# Altium integrated library TI Power Management Battery Management.IntLib: 950 symbols (part 46 of 48)
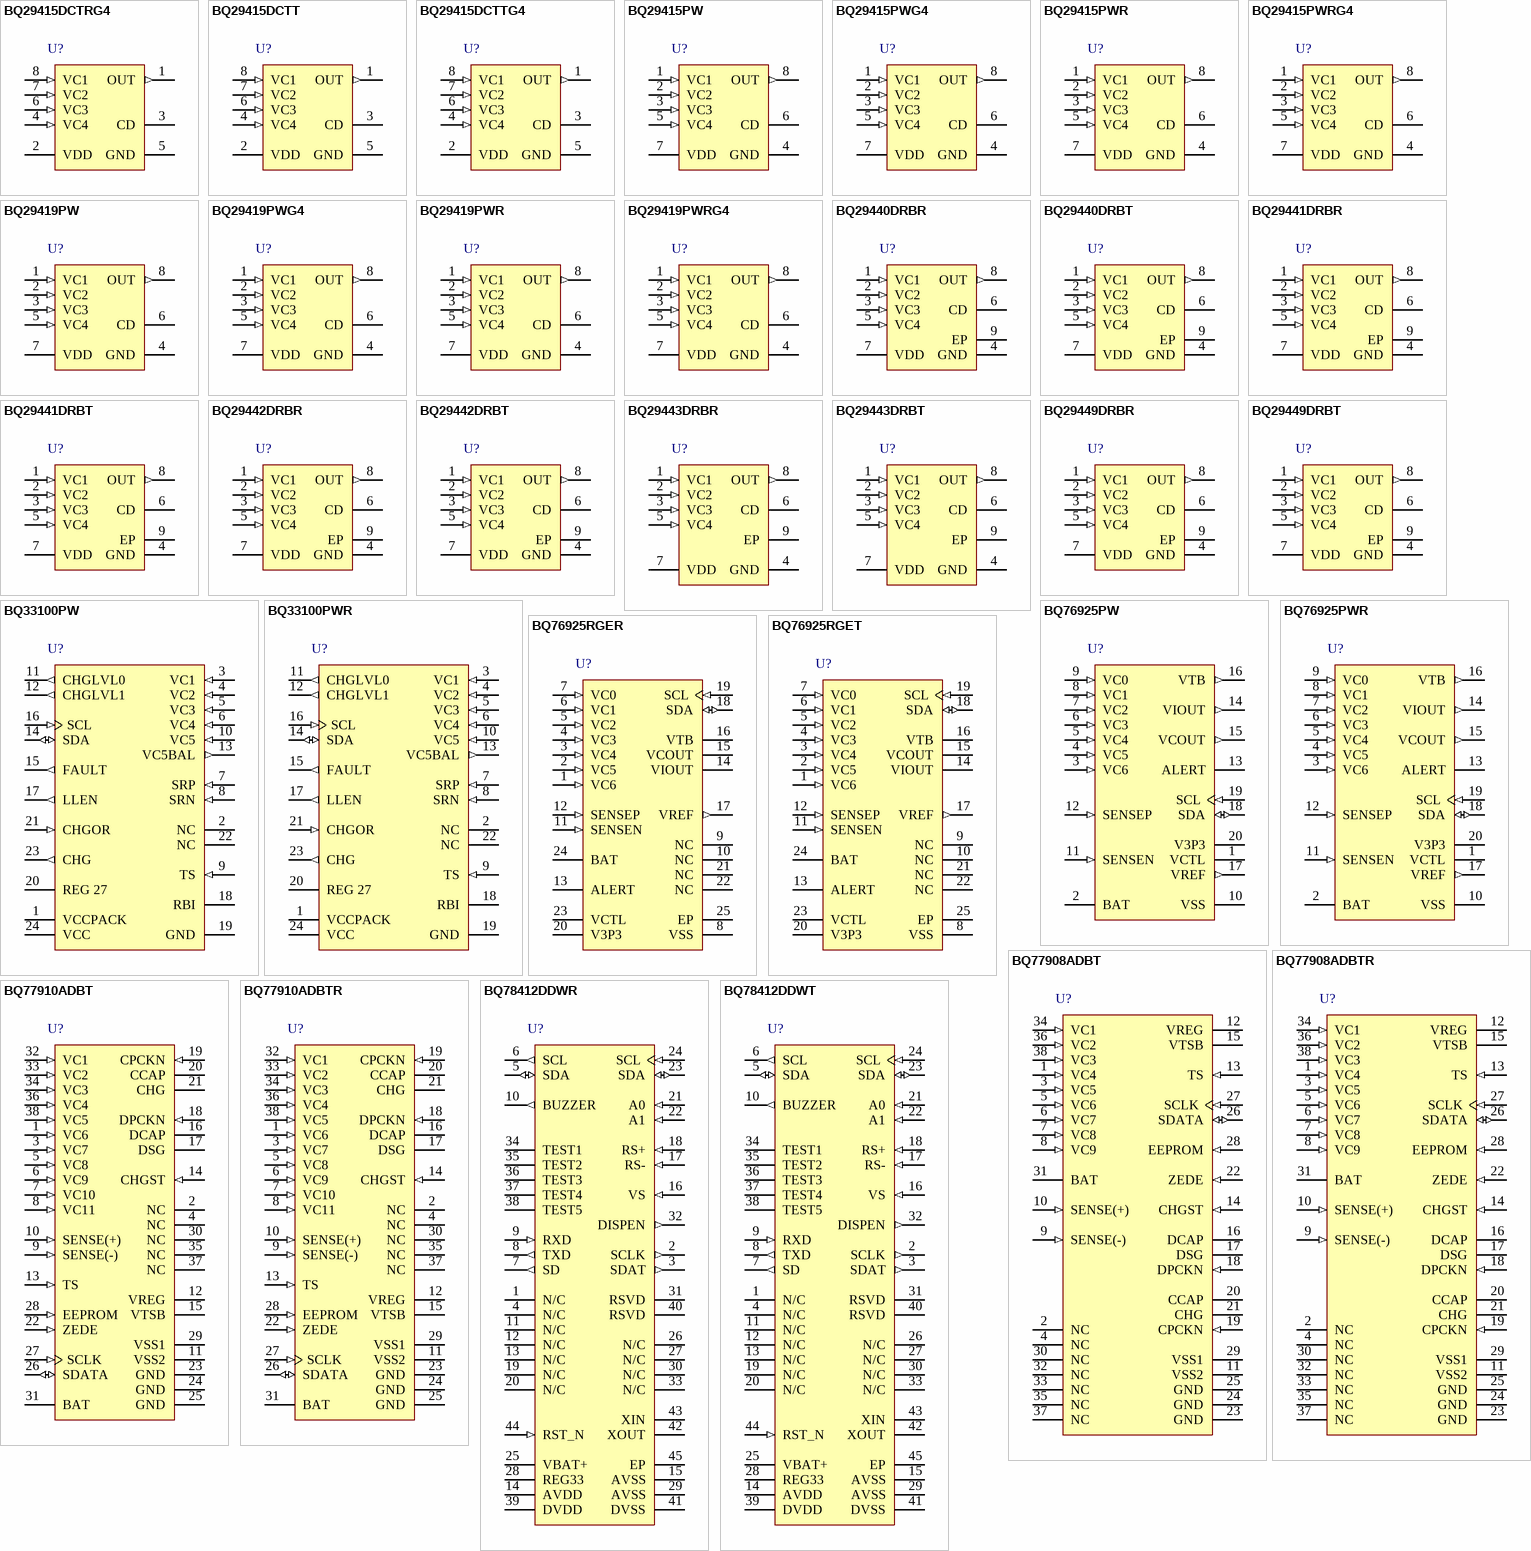
[diagram p79: symbols BQ29415DCTRG4 to BQ78412DDWT]

## BQ76925RGET
designator U?
Analog Front End for 3 to 6 Series Lithium-Ion Cells, -25 to 85 degC, 24-pin VQFN (RGE), Green (RoHS & no Sb/Br); PartNumber: BQ76925RGET; Manufacturer: Texas Instruments; Lead Acid: N; Li-Ion: Y; SubFamily: Lithium Ion Protection; DatasheetVersion: SLUSAM9B; PackageVersion: revG, Jul-2011; PackageReference: RGE24-2450X2450TP; PackageDescription: 24-Pin Plastic Quad Flatpack No-Lead, 4 x 4 mm Body, 0.5 mm Pitch; Supplier 1: Digi-Key; Supplier Part Number 1: 296-30167-2-ND; Supplier Part Number 3: 296-30167-6-ND; Eco-Plan: Green (RoHS & no Sb/Br); Li-Polymer: Y; NiCd: N; NiMH: N; Over Voltage Protection: N; Mounting Technology: Surface Mount; Code_JEDEC: MO-220; ComponentLink1Description: Datasheet; ComponentLink1URL: http://www.ti.com/general/docs/lit/getliterature.tsp?genericPartNumber=BQ76925&fileType=pdf
footprint RGE24-2450X2450TP (QFN, 24-Leads, Body 4x4mm, Pitch 0.5mm, Thermal Pad 2.45x2.45mm, TI Recommended)
pins: 1 VC6 (in) "Sense voltage for most positive cell.", 2 VC5 (in) "Sense voltage for second most positive cell.", 3 VC4 (in) "Sense voltage for third most positive cell.", 4 VC3 (in) "Sense voltage for fourth most positive cell.", 5 VC2 (in) "Sense voltage for fifth most positive cell.", 6 VC1 (in) "Sense voltage for least positive cell.", 7 VC0 (in) "Sense voltage for negative end of cell stack.", 8 VSS (power) "Ground.", 9 NC "No Connection (leave open).", 10 NC "No Connection (leave open).", 11 SENSEN (in) "Negative current sense.", 12 SENSEP (in) "Positive current sense.", 13 ALERT (oc) "Overcurrent alert (open drain).", 14 VIOUT (power) "Current measurement voltage.", 15 VCOUT (power) "Cell measurement voltage.", 16 VTB (power) "Bias voltage for thermistor network.", 17 VREF (out) "Reference voltage for ADC.", 18 SDA (io) "I2C Data (open drain).", 19 SCL (in) "I2C Clock (open drain).", 20 V3P3 (power) "3.3-V Regulator.", 21 NC "No Connection (leave open).", 22 NC "No Connection (leave open).", 23 VCTL (power) "3.3-V Regulator control voltage.", 24 BAT (power) "Supply voltage, tied to most positive cell.", 25 EP "The thermal pad must be soldered directly to the printed circuit board (PCB)."

## BQ77908ADBT
designator U?
Stand-Alone Multi-Cell Li-Ion / Li-Polymer Precision Protector, -40 to 85 degC, 38-pin TSSOP (DBT), Green (RoHS & no Sb/Br); PartNumber: BQ77908ADBT; Manufacturer: Texas Instruments; Lead Acid: N; Li-Ion: Y; SubFamily: Lithium Ion Protection; DatasheetVersion: SLUSAV5; PackageVersion: revI, Mar-2011; PackageReference: DBT38; PackageDescription: 38-Pin Plastic Small Outline 0.5 mm Pitch; Supplier 1: Digi-Key; Supplier Part Number 1: 296-31359-ND; Supplier Part Number 3: 595-BQ77908ADBT; Eco-Plan: Green (RoHS & no Sb/Br); Li-Polymer: Y; NiCd: N; NiMH: N; Over Voltage Protection: Y; Mounting Technology: Surface Mount; Code_JEDEC: MO-153; ComponentLink1Description: Datasheet; ComponentLink1URL: http://www.ti.com/general/docs/lit/getliterature.tsp?genericPartNumber=BQ77908A&fileType=pdf
footprint DBT38_N (TSSOP, 38-Leads, Body 9.7x4.4mm, Pitch 0.5mm, IPC Medium Density)
footprint DBT38_L (TSSOP, 38-Leads, Body 9.7x4.4mm, Pitch 0.5mm, IPC High Density)
footprint DBT38_M (TSSOP, 38-Leads, Body 9.7x4.4mm, Pitch 0.5mm, IPC Low Density)
pins: 1 VC4 (in) "Sense-voltage input terminal for fourth-most-positive cell", 2 NC "No connect (DO NOT CONNECT) externally. Failure to leave NC pins open can cause faulty operation.", 3 VC5 (in) "Sense-voltage input terminal for fifth-most-positive cell", 4 NC "No connect (DO NOT CONNECT) externally. Failure to leave NC pins open can cause faulty operation.", 5 VC6 (in) "Sense-voltage input terminal for sixth-most-positive cell", 6 VC7 (in) "Sense-voltage input terminal for seventh-most-positive cell", 7 VC8 (in) "Sense-voltage input terminal for eighthmost-positive (most-negative) cell", 8 VC9 (in) "Most-negative cell(-) terminal (BAT-)", 9 SENSE(-) (in) "Current-sense input", 10 SENSE(+) (in) "Current-sense input", 11 VSS2 (power) "Analog ground (substrate reference)", 12 VREG (power) "Integrated 3.3-V regulator output", 13 TS (in) "Temperature sensing input", 14 CHGST (in) "Charger-status input, used to detect charger connection/wakeup", 15 VTSB (power) "Thermistor bias supply (sourced from VREG)", 16 DCAP "Energy storage capacitor for discharge FET drive", 17 DSG "Discharge FET (n-channel) gate drive", 18 DPCKN (in) "Pack - discharge negative terminal (load return)", 19 CPCKN (in) "Pack - charger negative terminal (charger return)", 20 CCAP "Energy storage capacitor for charge FET drive", 21 CHG "Charge FET (n-channel) gate drive", 22 ZEDE (in) "Zero Delay test mode pin. Enables serial communications interface and minimizes protection delay times when connected to logic high.Connect to VSS for normal operation.A strong connection is recommended.", 23 GND (power) "Logic ground (not for power return or analog reference). Tie to VSS.", 24 GND (power) "Logic ground (not for power return or analog reference). Tie to VSS.", 25 GND (power) "Logic ground (not for power return or analog reference). Tie to VSS.", 26 SDATA (io) "Serial-communication data input/output used for EEPROM programming (open-drain)", 27 SCLK (in) "Serial-communication clock input used for EEPROM programming", 28 EEPROM (in) "EEPROM programming voltage input. Connect to VSS for normal operation.", 29 VSS1 (power) "Analog ground (substrate reference)", 30 NC "No connect (DO NOT CONNECT) externally. Failure to leave NC pins open can cause faulty operation.", 31 BAT (power) "Power supply voltage, tied to highest cell(+)", 32 NC "No connect (DO NOT CONNECT) externally. Failure to leave NC pins open can cause faulty operation.", 33 NC "No connect (DO NOT CONNECT) externally. Failure to leave NC pins open can cause faulty operation.", 34 VC1 (in) "Sense-voltage input terminal for most-positive cell", 35 NC "No connect (DO NOT CONNECT) externally. Failure to leave NC pins open can cause faulty operation.", 36 VC2 (in) "Sense-voltage input terminal for second-most-positive cell", 37 NC "No connect (DO NOT CONNECT) externally. Failure to leave NC pins open can cause faulty operation.", 38 VC3 (in) "Sense-voltage input terminal for third-most-positive cell"

## BQ77908ADBTR
designator U?
Stand-Alone Multi-Cell Li-Ion / Li-Polymer Precision Protector, -40 to 85 degC, 38-pin TSSOP (DBT), Green (RoHS & no Sb/Br); PartNumber: BQ77908ADBTR; Manufacturer: Texas Instruments; Lead Acid: N; Li-Ion: Y; SubFamily: Lithium Ion Protection; DatasheetVersion: SLUSAV5; PackageVersion: revI, Mar-2011; PackageReference: DBT38; PackageDescription: 38-Pin Plastic Small Outline 0.5 mm Pitch; Supplier 1: Digi-Key; Supplier Part Number 1: BQ77908ADBTR-ND; Supplier Part Number 3: 595-BQ77908ADBTR; Eco-Plan: Green (RoHS & no Sb/Br); Li-Polymer: Y; NiCd: N; NiMH: N; Over Voltage Protection: Y; Mounting Technology: Surface Mount; Code_JEDEC: MO-153; ComponentLink1Description: Datasheet; ComponentLink1URL: http://www.ti.com/general/docs/lit/getliterature.tsp?genericPartNumber=BQ77908A&fileType=pdf
footprint DBT38_N (TSSOP, 38-Leads, Body 9.7x4.4mm, Pitch 0.5mm, IPC Medium Density)
footprint DBT38_L (TSSOP, 38-Leads, Body 9.7x4.4mm, Pitch 0.5mm, IPC High Density)
footprint DBT38_M (TSSOP, 38-Leads, Body 9.7x4.4mm, Pitch 0.5mm, IPC Low Density)
pins: 1 VC4 (in) "Sense-voltage input terminal for fourth-most-positive cell", 2 NC "No connect (DO NOT CONNECT) externally. Failure to leave NC pins open can cause faulty operation.", 3 VC5 (in) "Sense-voltage input terminal for fifth-most-positive cell", 4 NC "No connect (DO NOT CONNECT) externally. Failure to leave NC pins open can cause faulty operation.", 5 VC6 (in) "Sense-voltage input terminal for sixth-most-positive cell", 6 VC7 (in) "Sense-voltage input terminal for seventh-most-positive cell", 7 VC8 (in) "Sense-voltage input terminal for eighthmost-positive (most-negative) cell", 8 VC9 (in) "Most-negative cell(-) terminal (BAT-)", 9 SENSE(-) (in) "Current-sense input", 10 SENSE(+) (in) "Current-sense input", 11 VSS2 (power) "Analog ground (substrate reference)", 12 VREG (power) "Integrated 3.3-V regulator output", 13 TS (in) "Temperature sensing input", 14 CHGST (in) "Charger-status input, used to detect charger connection/wakeup", 15 VTSB (power) "Thermistor bias supply (sourced from VREG)", 16 DCAP "Energy storage capacitor for discharge FET drive", 17 DSG "Discharge FET (n-channel) gate drive", 18 DPCKN (in) "Pack - discharge negative terminal (load return)", 19 CPCKN (in) "Pack - charger negative terminal (charger return)", 20 CCAP "Energy storage capacitor for charge FET drive", 21 CHG "Charge FET (n-channel) gate drive", 22 ZEDE (in) "Zero Delay test mode pin. Enables serial communications interface and minimizes protection delay times when connected to logic high.Connect to VSS for normal operation.A strong connection is recommended.", 23 GND (power) "Logic ground (not for power return or analog reference). Tie to VSS.", 24 GND (power) "Logic ground (not for power return or analog reference). Tie to VSS.", 25 GND (power) "Logic ground (not for power return or analog reference). Tie to VSS.", 26 SDATA (io) "Serial-communication data input/output used for EEPROM programming (open-drain)", 27 SCLK (in) "Serial-communication clock input used for EEPROM programming", 28 EEPROM (in) "EEPROM programming voltage input. Connect to VSS for normal operation.", 29 VSS1 (power) "Analog ground (substrate reference)", 30 NC "No connect (DO NOT CONNECT) externally. Failure to leave NC pins open can cause faulty operation.", 31 BAT (power) "Power supply voltage, tied to highest cell(+)", 32 NC "No connect (DO NOT CONNECT) externally. Failure to leave NC pins open can cause faulty operation.", 33 NC "No connect (DO NOT CONNECT) externally. Failure to leave NC pins open can cause faulty operation.", 34 VC1 (in) "Sense-voltage input terminal for most-positive cell", 35 NC "No connect (DO NOT CONNECT) externally. Failure to leave NC pins open can cause faulty operation.", 36 VC2 (in) "Sense-voltage input terminal for second-most-positive cell", 37 NC "No connect (DO NOT CONNECT) externally. Failure to leave NC pins open can cause faulty operation.", 38 VC3 (in) "Sense-voltage input terminal for third-most-positive cell"

## BQ77910ADBT
designator U?
Standalone 4-10 Cell Precision Protector for Li-Ion Chemistries, -40 to 85 degC, 38-pin TSSOP (DBT), Green (RoHS & no Sb/Br); PartNumber: BQ77910ADBT; Manufacturer: Texas Instruments; Lead Acid: N; Li-Ion: Y; SubFamily: Lithium Ion Protection; DatasheetVersion: SLUSAV6; PackageVersion: revI, Mar-2011; PackageReference: DBT38; PackageDescription: 38-Pin Plastic Small Outline 0.5 mm Pitch; Supplier 1: Digi-Key; Supplier Part Number 1: 296-31360-ND; Supplier Part Number 3: 595-BQ77910ADBT; Eco-Plan: Green (RoHS & no Sb/Br); Li-Polymer: Y; NiCd: N; NiMH: N; Over Voltage Protection: Y; Mounting Technology: Surface Mount; Code_JEDEC: MO-153; ComponentLink1Description: Datasheet; ComponentLink1URL: http://www.ti.com/general/docs/lit/getliterature.tsp?genericPartNumber=BQ77910A&fileType=pdf
footprint DBT38_N (TSSOP, 38-Leads, Body 9.7x4.4mm, Pitch 0.5mm, IPC Medium Density)
footprint DBT38_L (TSSOP, 38-Leads, Body 9.7x4.4mm, Pitch 0.5mm, IPC High Density)
footprint DBT38_M (TSSOP, 38-Leads, Body 9.7x4.4mm, Pitch 0.5mm, IPC Low Density)
pins: 1 VC6 (in) "Sense-voltage input terminal for sixth-most-positive cell.", 2 NC "No connect (DO NOT CONNECT) externally. Failure to leave NC pins open can cause faulty operation.", 3 VC7 (in) "Sense-voltage input terminal for seventh-most-positive cell.", 4 NC "No connect (DO NOT CONNECT) externally. Failure to leave NC pins open can cause faulty operation.", 5 VC8 (in) "Sense-voltage input terminal for eighth-most-positive cell.", 6 VC9 (in) "Sense-voltage input terminal for ninth-most-positive cell.", 7 VC10 (in) "Sense-voltage input terminal for tenthmost-positive (most-negative) cell.", 8 VC11 (in) "Most-negative cell(-) terminal (BAT-).", 9 SENSE(-) (in) "Current-sense input.", 10 SENSE(+) (in) "Current-sense input.", 11 VSS2 (power) "Analog ground (substrate reference).", 12 VREG (power) "Integrated 3.3-V regulator output.", 13 TS (in) "Temperature sensing input.", 14 CHGST (in) "Charger-status input, used to detect charger connection/wakeup.", 15 VTSB "Thermistor bias supply (sourced from VREG).", 16 DCAP "Energy storage capacitor for discharge FET drive.", 17 DSG "Discharge FET (n-channel) gate drive.", 18 DPCKN (in) "Pack - discharge negative terminal (load return).", 19 CPCKN (in) "Pack - charger negative terminal (charger return).", 20 CCAP "Energy storage capacitor for charge FET drive.", 21 CHG "Charge FET (n-channel) gate drive.", 22 ZEDE (in) "Zero Delay test mode pin. Enables serial communications interface and minimizes protection delay times when connected to logic high. Connect to VSS for normal operation. A strong connection is recommended.", 23 GND (power) "Logic ground (not for power return or analog reference). Tie to VSS.", 24 GND (power) "Logic ground (not for power return or analog reference). Tie to VSS.", 25 GND (power) "Logic ground (not for power return or analog reference). Tie to VSS.", 26 SDATA (io) "Serial-communication data input/output used for EEPROM programming (open-drain).", 27 SCLK (in) "Serial-communication clock input used for EEPROM programming.", 28 EEPROM (in) "EEPROM programming voltage input. Connect to VSS for normal operation.", 29 VSS1 (power) "Analog ground (substrate reference).", 30 NC "No connect (DO NOT CONNECT) externally. Failure to leave NC pins open can cause faulty operation.", 31 BAT (power) "Power supply voltage, tied to highest cell(+).", 32 VC1 (in) "Sense-voltage input terminal for most-positive cell.", 33 VC2 (in) "Sense-voltage input terminal for second-most-positive cell.", 34 VC3 (in) "Sense-voltage input terminal for third-most-positive cell.", 35 NC "No connect (DO NOT CONNECT) externally. Failure to leave NC pins open can cause faulty operation.", 36 VC4 (in) "Sense-voltage input terminal for fourth-most-positive cell.", 37 NC "No connect (DO NOT CONNECT) externally. Failure to leave NC pins open can cause faulty operation.", 38 VC5 (in) "Sense-voltage input terminal for fifth-most-positive cell."

## BQ77910ADBTR
designator U?
Standalone 4-10 Cell Precision Protector for Li-Ion Chemistries, -40 to 85 degC, 38-pin TSSOP (DBT), Green (RoHS & no Sb/Br); PartNumber: BQ77910ADBTR; Manufacturer: Texas Instruments; Lead Acid: N; Li-Ion: Y; SubFamily: Battery Charge Management; DatasheetVersion: SLUSAV6; PackageVersion: revI, Mar-2011; PackageReference: DBT38; PackageDescription: 38-Pin Plastic Small Outline 0.5 mm Pitch; Supplier 1: Digi-Key; Supplier Part Number 1: 296-30251-2-ND; Supplier Part Number 3: 296-30251-6-ND; Eco-Plan: Green (RoHS & no Sb/Br); Li-Polymer: Y; NiCd: N; NiMH: N; Over Voltage Protection: Y; Mounting Technology: Surface Mount; Code_JEDEC: MO-153; ComponentLink1Description: Datasheet; ComponentLink1URL: http://www.ti.com/general/docs/lit/getliterature.tsp?genericPartNumber=BQ77910A&fileType=pdf
footprint DBT38_N (TSSOP, 38-Leads, Body 9.7x4.4mm, Pitch 0.5mm, IPC Medium Density)
footprint DBT38_L (TSSOP, 38-Leads, Body 9.7x4.4mm, Pitch 0.5mm, IPC High Density)
footprint DBT38_M (TSSOP, 38-Leads, Body 9.7x4.4mm, Pitch 0.5mm, IPC Low Density)
pins: 1 VC6 (in) "Sense-voltage input terminal for sixth-most-positive cell.", 2 NC "No connect (DO NOT CONNECT) externally. Failure to leave NC pins open can cause faulty operation.", 3 VC7 (in) "Sense-voltage input terminal for seventh-most-positive cell.", 4 NC "No connect (DO NOT CONNECT) externally. Failure to leave NC pins open can cause faulty operation.", 5 VC8 (in) "Sense-voltage input terminal for eighth-most-positive cell.", 6 VC9 (in) "Sense-voltage input terminal for ninth-most-positive cell.", 7 VC10 (in) "Sense-voltage input terminal for tenthmost-positive (most-negative) cell.", 8 VC11 (in) "Most-negative cell(-) terminal (BAT-).", 9 SENSE(-) (in) "Current-sense input.", 10 SENSE(+) (in) "Current-sense input.", 11 VSS2 (power) "Analog ground (substrate reference).", 12 VREG (power) "Integrated 3.3-V regulator output.", 13 TS (in) "Temperature sensing input.", 14 CHGST (in) "Charger-status input, used to detect charger connection/wakeup.", 15 VTSB "Thermistor bias supply (sourced from VREG).", 16 DCAP "Energy storage capacitor for discharge FET drive.", 17 DSG "Discharge FET (n-channel) gate drive.", 18 DPCKN (in) "Pack - discharge negative terminal (load return).", 19 CPCKN (in) "Pack - charger negative terminal (charger return).", 20 CCAP "Energy storage capacitor for charge FET drive.", 21 CHG "Charge FET (n-channel) gate drive.", 22 ZEDE (in) "Zero Delay test mode pin. Enables serial communications interface and minimizes protection delay times when connected to logic high. Connect to VSS for normal operation. A strong connection is recommended.", 23 GND (power) "Logic ground (not for power return or analog reference). Tie to VSS.", 24 GND (power) "Logic ground (not for power return or analog reference). Tie to VSS.", 25 GND (power) "Logic ground (not for power return or analog reference). Tie to VSS.", 26 SDATA (io) "Serial-communication data input/output used for EEPROM programming (open-drain).", 27 SCLK (in) "Serial-communication clock input used for EEPROM programming.", 28 EEPROM (in) "EEPROM programming voltage input. Connect to VSS for normal operation.", 29 VSS1 (power) "Analog ground (substrate reference).", 30 NC "No connect (DO NOT CONNECT) externally. Failure to leave NC pins open can cause faulty operation.", 31 BAT (power) "Power supply voltage, tied to highest cell(+).", 32 VC1 (in) "Sense-voltage input terminal for most-positive cell.", 33 VC2 (in) "Sense-voltage input terminal for second-most-positive cell.", 34 VC3 (in) "Sense-voltage input terminal for third-most-positive cell.", 35 NC "No connect (DO NOT CONNECT) externally. Failure to leave NC pins open can cause faulty operation.", 36 VC4 (in) "Sense-voltage input terminal for fourth-most-positive cell.", 37 NC "No connect (DO NOT CONNECT) externally. Failure to leave NC pins open can cause faulty operation.", 38 VC5 (in) "Sense-voltage input terminal for fifth-most-positive cell."

## BQ78412DDWR
designator U?
Pb-Acid Battery State-of-Charge Indicator with Run-Time Display, -40 to 85 degC, 44-pin HTSSOP (DDW), Green (RoHS & no Sb/Br); PartNumber: BQ78412DDWR; Manufacturer: Texas Instruments; Lead Acid: N; SubFamily: Battery Fuel Gauge; DatasheetVersion: SLUSAA0; PackageVersion: revB, Oct-2006; PackageReference: DDW44-7600X3850TP; PackageDescription: 44-Pin PowerPAD Small Outline Package (Pad Down) 0.635 mm Pitch; Supplier 1: Digi-Key; Supplier Part Number 1: BQ78412DDWR-ND; Supplier Part Number 3: 595-BQ78412DDWR; Eco-Plan: Green (RoHS & no Sb/Br); Li-Ion: N; Li-Polymer: N; NiCd: N; NiMH: N; Over Voltage Protection: N; Mounting Technology: Surface Mount; ComponentLink1Description: Datasheet; ComponentLink1URL: http://www.ti.com/general/docs/lit/getliterature.tsp?genericPartNumber=BQ78412&fileType=pdf
footprint DDW44-7600X3850TP_N (TSOP, 44-Leads, Body 14x6.1mm, Pitch 0.635mm, Thermal Pad 8.3x4.2mm, IPC Medium Density)
footprint DDW44-7600X3850TP_L (TSOP, 44-Leads, Body 14x6.1mm, Pitch 0.635mm, Thermal Pad 8.3x4.2mm, IPC High Density)
footprint DDW44-7600X3850TP_M (TSOP, 44-Leads, Body 14x6.1mm, Pitch 0.635mm, Thermal Pad 8.3x4.2mm, IPC Low Density)
pins: 1 N/C "No connection", 2 SCLK (out) "Low-to-high transition clocks data into external serial in, parallel out shift register.", 3 SDAT (out) "Serial display data to serial in, parallel out shift register. A low bit turns on an LED.", 4 N/C "No connection", 5 SDA (io) "I2C data", 6 SCL (out) "I2C clock output", 7 SD (out) "IR XCVR Shutdown; HIGH=XCVR in shutdown, LOW=XCVR Active", 8 TXD (out) "UART TX data", 9 RXD (in) "UART RX data", 10 BUZZER (out) "Buzzer output. Active high when alarm condition is detected.", 11 N/C "No connection", 12 N/C "No connection", 13 N/C "No connection", 14 AVDD (power) "3.3-V power to the analog logic. Typically connected to REG33.", 15 AVSS (power) "Connect to ground.", 16 VS (in) "Sense voltage. Connect to battery positive.", 17 RS- (in) "Current sense negative", 18 RS+ (in) "Current sense positive", 19 N/C "No connection", 20 N/C "No connection", 21 A0 (in) "Configuration input. Connect to ground.", 22 A1 (in) "Configuration input. Connect to ground.", 23 SDA (io) "I2C data for internal use. Connect to SDA pin 5.", 24 SCL (in) "I2C clock for internal use. Connect to SCL pin 6.", 25 VBAT+ (power) "Input to internal regulator.", 26 N/C "No connection", 27 N/C "No connection", 28 REG33 (power) "Regulated 3.3-V power output.", 29 AVSS (power) "Connect to ground.", 30 N/C "No connection", 31 RSVD "Reserved, no connection required.", 32 DISPEN (out) "Active high output, turns on display enable transistor. Not required in all applications. Blanks display during updates.", 33 N/C "No connection", 34 TEST1 "Test pin, no connection", 35 TEST2 "Test pin, no connection", 36 TEST3 "Test pin, no connection", 37 TEST4 "Test pin, no connection", 38 TEST5 "Test pin, no connection", 39 DVDD (power) "3.3-V supply to the digital logic. Connect a 2.2- uF capacitor to VSS. Typically connected to REG33.", 40 RSVD "Reserved, no connection required.", 41 DVSS (power) "Connect to ground", 42 XOUT "Output terminal of 8-MHz crystal oscillator or crystal pin. (Optional: Can be left unconnected to use internal oscillator)", 43 XIN "Input terminal of 8-MHz crystal oscillator or crystal pin. (Optional: Can be left unconnected to use internal oscillator)", 44 RST_N (in) "Connect to external RC network for power-up reset.", 45 EP (power) "Thermal pad"

## BQ78412DDWT
designator U?
Pb-Acid Battery State-of-Charge Indicator with Run-Time Display, -40 to 85 degC, 44-pin HTSSOP (DDW), Green (RoHS & no Sb/Br); PartNumber: BQ78412DDWT; Manufacturer: Texas Instruments; Lead Acid: N; SubFamily: Battery Fuel Gauge; DatasheetVersion: SLUSAA0; PackageVersion: revB, Oct-2006; PackageReference: DDW44-7600X3850TP; PackageDescription: 44-Pin PowerPAD Small Outline Package (Pad Down) 0.635 mm Pitch; Supplier 1: Digi-Key; Supplier Part Number 1: 296-27954-2-ND; Supplier Part Number 3: 296-27954-6-ND; Eco-Plan: Green (RoHS & no Sb/Br); Li-Ion: N; Li-Polymer: N; NiCd: N; NiMH: N; Over Voltage Protection: N; Mounting Technology: Surface Mount; ComponentLink1Description: Datasheet; ComponentLink1URL: http://www.ti.com/general/docs/lit/getliterature.tsp?genericPartNumber=BQ78412&fileType=pdf
footprint DDW44-7600X3850TP_N (TSOP, 44-Leads, Body 14x6.1mm, Pitch 0.635mm, Thermal Pad 8.3x4.2mm, IPC Medium Density)
footprint DDW44-7600X3850TP_L (TSOP, 44-Leads, Body 14x6.1mm, Pitch 0.635mm, Thermal Pad 8.3x4.2mm, IPC High Density)
footprint DDW44-7600X3850TP_M (TSOP, 44-Leads, Body 14x6.1mm, Pitch 0.635mm, Thermal Pad 8.3x4.2mm, IPC Low Density)
pins: 1 N/C "No connection", 2 SCLK (out) "Low-to-high transition clocks data into external serial in, parallel out shift register.", 3 SDAT (out) "Serial display data to serial in, parallel out shift register. A low bit turns on an LED.", 4 N/C "No connection", 5 SDA (io) "I2C data", 6 SCL (out) "I2C clock output", 7 SD (out) "IR XCVR Shutdown; HIGH=XCVR in shutdown, LOW=XCVR Active", 8 TXD (out) "UART TX data", 9 RXD (in) "UART RX data", 10 BUZZER (out) "Buzzer output. Active high when alarm condition is detected.", 11 N/C "No connection", 12 N/C "No connection", 13 N/C "No connection", 14 AVDD (power) "3.3-V power to the analog logic. Typically connected to REG33.", 15 AVSS (power) "Connect to ground.", 16 VS (in) "Sense voltage. Connect to battery positive.", 17 RS- (in) "Current sense negative", 18 RS+ (in) "Current sense positive", 19 N/C "No connection", 20 N/C "No connection", 21 A0 (in) "Configuration input. Connect to ground.", 22 A1 (in) "Configuration input. Connect to ground.", 23 SDA (io) "I2C data for internal use. Connect to SDA pin 5.", 24 SCL (in) "I2C clock for internal use. Connect to SCL pin 6.", 25 VBAT+ (power) "Input to internal regulator.", 26 N/C "No connection", 27 N/C "No connection", 28 REG33 (power) "Regulated 3.3-V power output.", 29 AVSS (power) "Connect to ground.", 30 N/C "No connection", 31 RSVD "Reserved, no connection required.", 32 DISPEN (out) "Active high output, turns on display enable transistor. Not required in all applications. Blanks display during updates.", 33 N/C "No connection", 34 TEST1 "Test pin, no connection", 35 TEST2 "Test pin, no connection", 36 TEST3 "Test pin, no connection", 37 TEST4 "Test pin, no connection", 38 TEST5 "Test pin, no connection", 39 DVDD (power) "3.3-V supply to the digital logic. Connect a 2.2- uF capacitor to VSS. Typically connected to REG33.", 40 RSVD "Reserved, no connection required.", 41 DVSS (power) "Connect to ground", 42 XOUT "Output terminal of 8-MHz crystal oscillator or crystal pin. (Optional: Can be left unconnected to use internal oscillator)", 43 XIN "Input terminal of 8-MHz crystal oscillator or crystal pin. (Optional: Can be left unconnected to use internal oscillator)", 44 RST_N (in) "Connect to external RC network for power-up reset.", 45 EP (power) "Thermal pad"

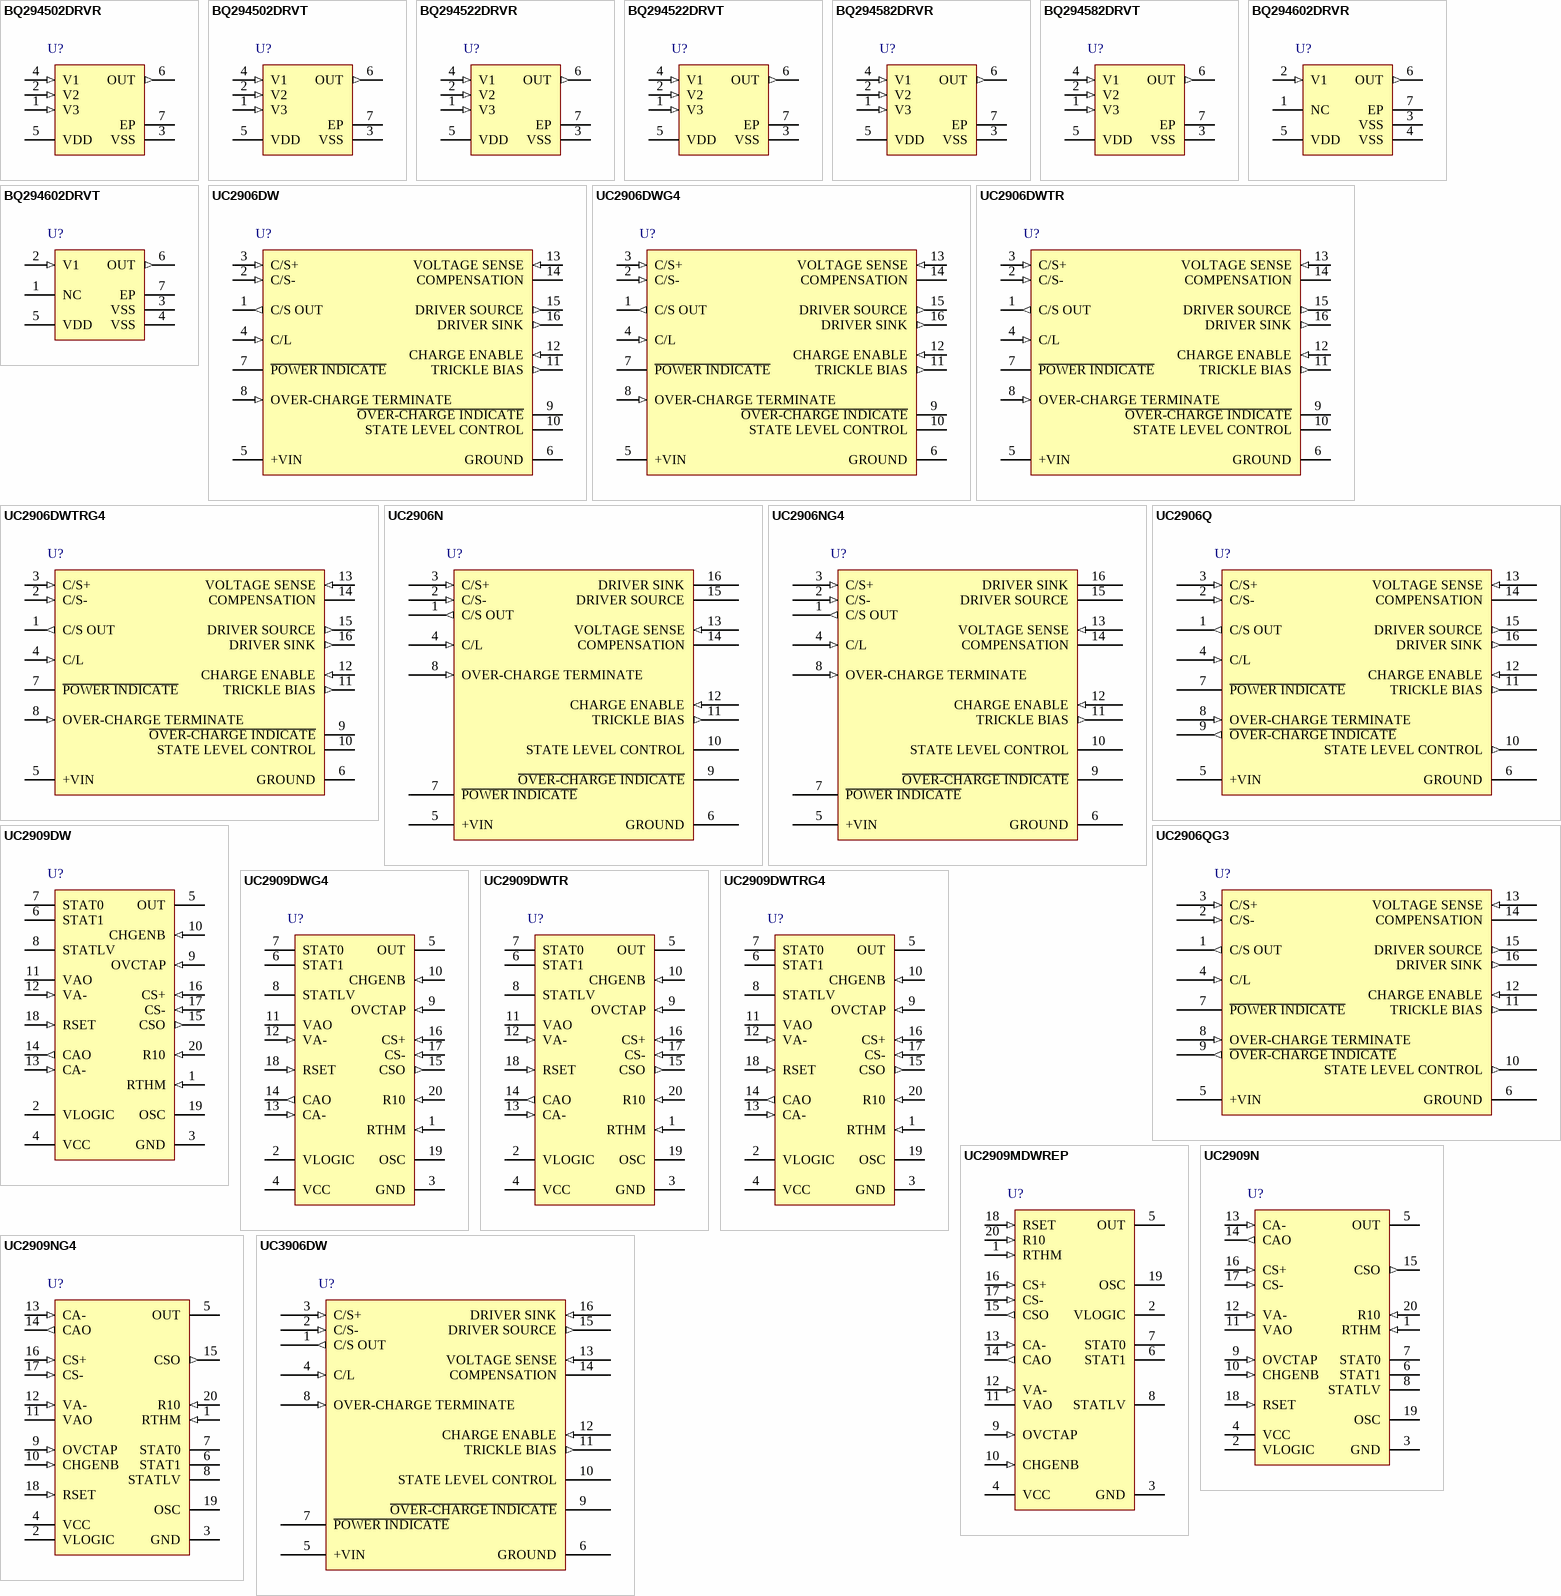
[diagram p33: symbols BQ294502DRVR to UC3906DW]
